# Altium integrated library RL2.IntLib: 663 symbols (part 2 of 4) (continued)
## L550R (continued)
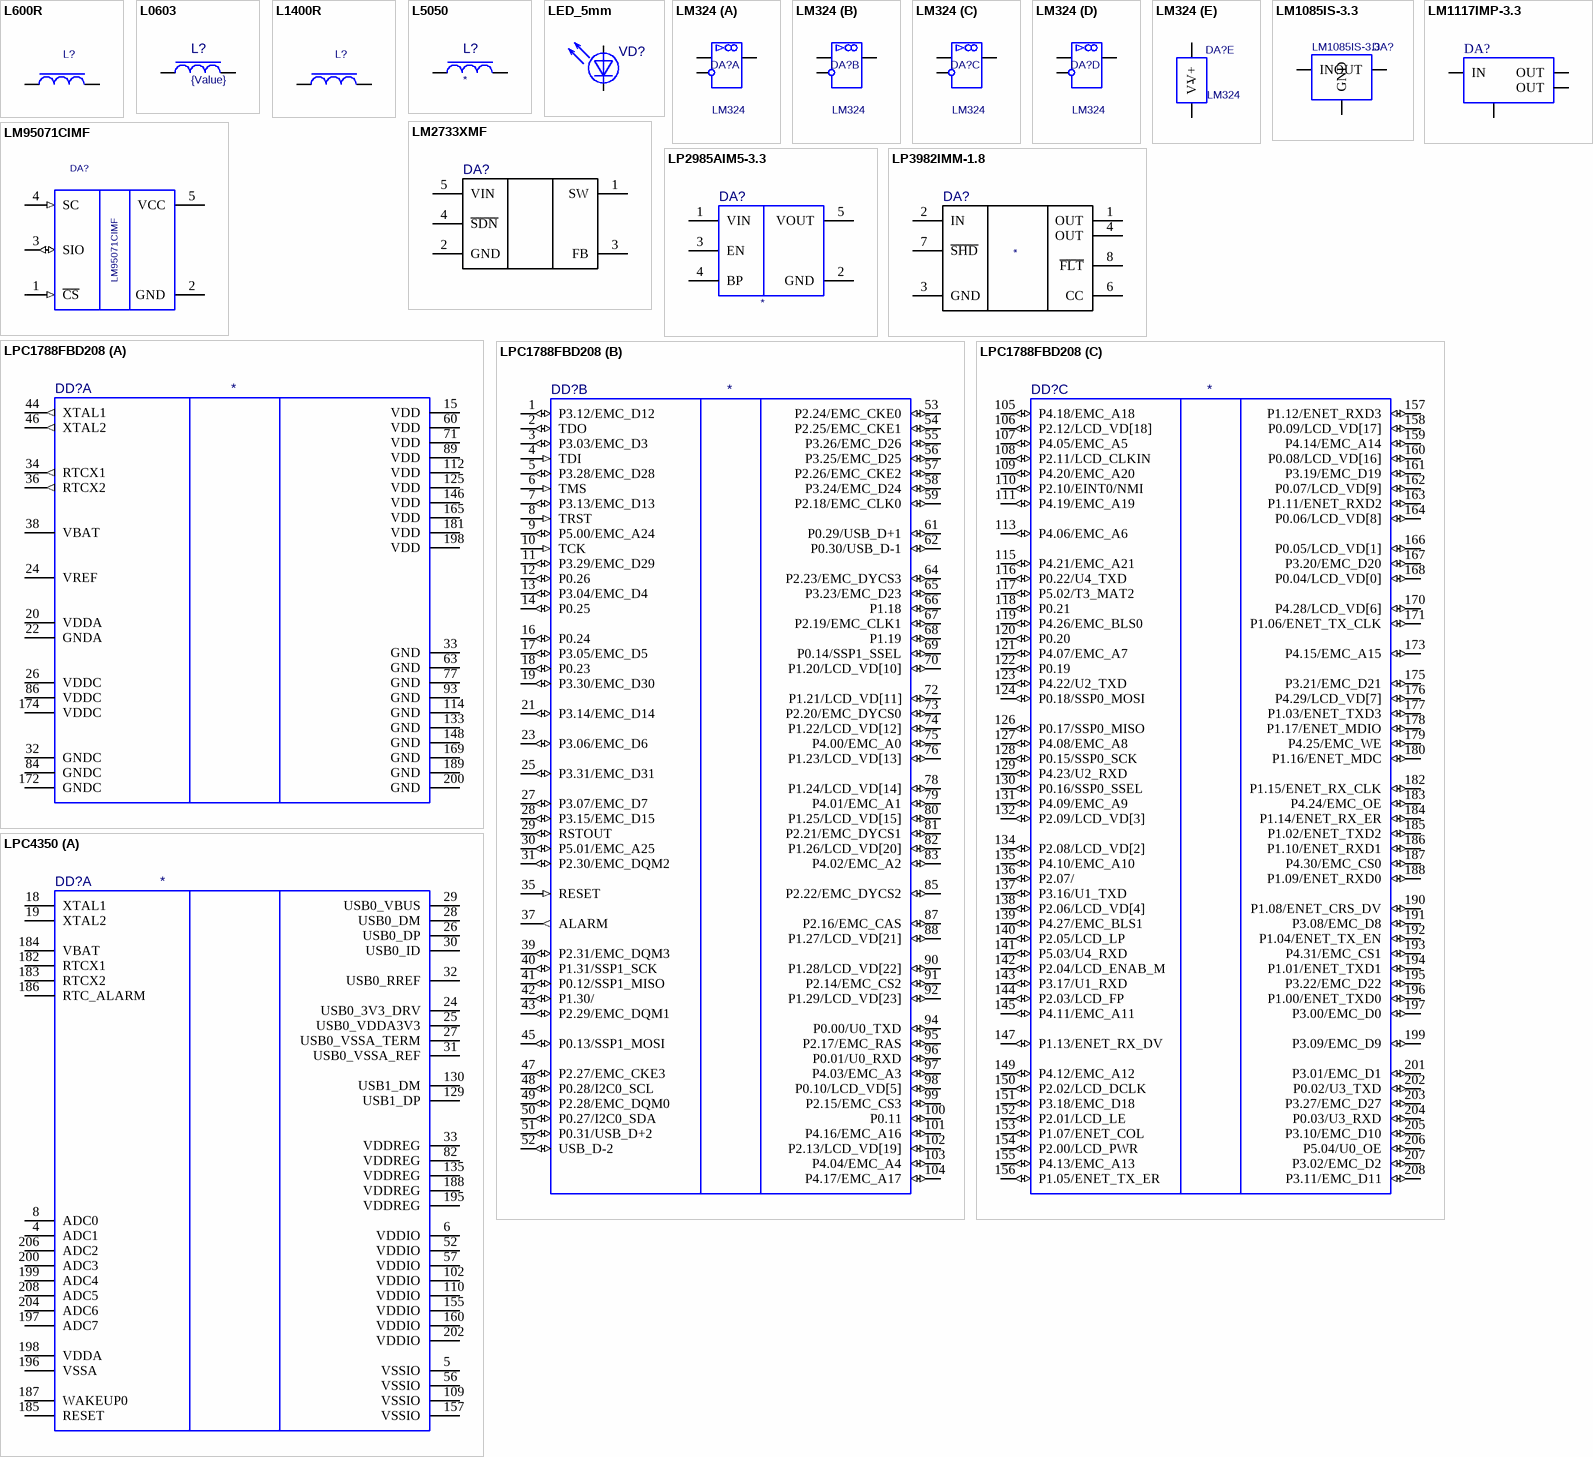
[diagram p14: symbols L600R to LPC4350]

## L600R
designator L?  (value not drawn)
L600R; Value: *
footprint L600R
pins: 1, 2

## L0603
designator L?  value {Value}  (hidden comment: *)
L0603
footprint L0603
pins: 1, 2

## L1400R
designator L?  (value not drawn)
L1400R; Value: *
footprint L1400R_L1400R-1
footprint L1400R_Primary
pins: 1 I/OA0, 2 I/OB

## L5050
designator L?
Value: *
footprint L5050
pins: 1, 2

## LED_5mm
designator VD?  (value not drawn)
footprint LED_5mm
pins: 1, 2

## LM324
designator DA?
Value: *
footprint DIP14_Primary
footprint DIP14_prim125
part A pins: 1, 2, 3
part B pins: 5, 6, 7
part C pins: 8, 9, 10
part D pins: 12, 13, 14
part E pins: 4 V+ (power), 11 V- (power)

## LM1085IS-3.3
designator DA?
Value: *
footprint TO-263
pins: 1 GND, 2 OUT, 3 IN, 4 hidden

## LM1117IMP-3.3
designator DA?  (value not drawn)
LM1117IMP-3.3; Value: *
footprint SOT-223
pins: 1 G, 2 OUT, 3 IN, 4 OUT

## LM2733XMF
designator DA?
footprint SOT23-5
pins: 1 SW, 2 GND, 3 FB, 4 ~{SDN}, 5 VIN

## LM95071CIMF
designator DA?
Value: *
footprint SOT23-5
signal-integrity model LM95071_si (Model Description)
pins: 1 ~{CS} (in), 2 GND (power), 3 SIO (io), 4 SC (in), 5 VCC (power)

## LP2985AIM5-3.3
designator DA?
footprint SOT23-5
pins: 1 VIN, 2 GND, 3 EN, 4 BP, 5 VOUT

## LP3982IMM-1.8
designator DA?
footprint MSOP8_LDO
pins: 1 OUT, 2 IN, 3 GND, 4 OUT, 6 CC, 7 ~{SHD}, 8 ~{F}~{LT}

## LPC1788FBD208
designator DD?
footprint QFP22-208
signal-integrity model Model Name (Model Description)
part A pins: 15 VDD (power), 20 VDDA (power), 22 GNDA (power), 24 VREF (power), 26 VDDC (power), 32 GNDC (power), 33 GND (power), 34 RTCX1 (out), 36 RTCX2 (out), 38 VBAT (power), 44 XTAL1 (out), 46 XTAL2 (out), 60 VDD (power), 63 GND (power), 71 VDD (power), 77 GND (power), 84 GNDC (power), 86 VDDC (power), 89 VDD (power), 93 GND (power), 112 VDD (power), 114 GND (power), 125 VDD (power), 133 GND (power), 146 VDD (power), 148 GND (power), 165 VDD (power), 169 GND (power), 172 GNDC (power), 174 VDDC (power), 181 VDD (power), 189 GND (power), 198 VDD (power), 200 GND (power)
part B pins: 1 P3.12/EMC_D12 (io), 2 TDO (io), 3 P3.03/EMC_D3 (io), 4 TDI (in), 5 P3.28/EMC_D28 (io), 6 TMS (in), 7 P3.13/EMC_D13 (io), 8 TRST (in), 9 P5.00/EMC_A24 (io), 10 TCK (in), 11 P3.29/EMC_D29 (io), 12 P0.26 (io), 13 P3.04/EMC_D4 (io), 14 P0.25 (io), 16 P0.24 (io), 17 P3.05/EMC_D5 (io), 18 P0.23 (io), 19 P3.30/EMC_D30 (io), 21 P3.14/EMC_D14 (io), 23 P3.06/EMC_D6 (io), 25 P3.31/EMC_D31 (io), 27 P3.07/EMC_D7 (io), 28 P3.15/EMC_D15 (io), 29 RSTOUT (io), 30 P5.01/EMC_A25 (io), 31 P2.30/EMC_DQM2 (io), 35 RESET (in), 37 ALARM (out), 39 P2.31/EMC_DQM3 (io), 40 P1.31/SSP1_SCK (io), 41 P0.12/SSP1_MISO (io), 42 P1.30/ (io), 43 P2.29/EMC_DQM1 (io), 45 P0.13/SSP1_MOSI (io), 47 P2.27/EMC_CKE3 (io), 48 P0.28/I2C0_SCL (io), 49 P2.28/EMC_DQM0 (io), 50 P0.27/I2C0_SDA (io), 51 P0.31/USB_D+2 (io), 52 USB_D-2 (io), 53 P2.24/EMC_CKE0 (io), 54 P2.25/EMC_CKE1 (io), 55 P3.26/EMC_D26 (io), 56 P3.25/EMC_D25 (io), 57 P2.26/EMC_CKE2 (io), 58 P3.24/EMC_D24 (io), 59 P2.18/EMC_CLK0 (io), 61 P0.29/USB_D+1 (io), 62 P0.30/USB_D-1 (io), 64 P2.23/EMC_DYCS3 (io), 65 P3.23/EMC_D23 (io), 66 P1.18 (io), 67 P2.19/EMC_CLK1 (io), 68 P1.19 (io), 69 P0.14/SSP1_SSEL (io), 70 P1.20/LCD_VD[10] (io), 72 P1.21/LCD_VD[11] (io), 73 P2.20/EMC_DYCS0 (io), 74 P1.22/LCD_VD[12] (io), 75 P4.00/EMC_A0 (io), 76 P1.23/LCD_VD[13] (io), 78 P1.24/LCD_VD[14] (io), 79 P4.01/EMC_A1 (io), 80 P1.25/LCD_VD[15] (io), 81 P2.21/EMC_DYCS1 (io), 82 P1.26/LCD_VD[20] (io), 83 P4.02/EMC_A2 (io), 85 P2.22/EMC_DYCS2 (io), 87 P2.16/EMC_CAS (io), 88 P1.27/LCD_VD[21] (io), 90 P1.28/LCD_VD[22] (io), 91 P2.14/EMC_CS2 (io), 92 P1.29/LCD_VD[23] (io), 94 P0.00/U0_TXD (io), 95 P2.17/EMC_RAS (io), 96 P0.01/U0_RXD (io), 97 P4.03/EMC_A3 (io), 98 P0.10/LCD_VD[5] (io), 99 P2.15/EMC_CS3 (io), 100 P0.11 (io), 101 P4.16/EMC_A16 (io), 102 P2.13/LCD_VD[19] (io), 103 P4.04/EMC_A4 (io), 104 P4.17/EMC_A17 (io)
part C pins: 105 P4.18/EMC_A18 (io), 106 P2.12/LCD_VD[18] (io), 107 P4.05/EMC_A5 (io), 108 P2.11/LCD_CLKIN (io), 109 P4.20/EMC_A20 (io), 110 P2.10/EINT0/NMI (io), 111 P4.19/EMC_A19 (io), 113 P4.06/EMC_A6 (io), 115 P4.21/EMC_A21 (io), 116 P0.22/U4_TXD (io), 117 P5.02/T3_MAT2 (io), 118 P0.21 (io), 119 P4.26/EMC_BLS0 (io), 120 P0.20 (io), 121 P4.07/EMC_A7 (io), 122 P0.19 (io), 123 P4.22/U2_TXD (io), 124 P0.18/SSP0_MOSI (io), 126 P0.17/SSP0_MISO (io), 127 P4.08/EMC_A8 (io), 128 P0.15/SSP0_SCK (io), 129 P4.23/U2_RXD (io), 130 P0.16/SSP0_SSEL (io), 131 P4.09/EMC_A9 (io), 132 P2.09/LCD_VD[3] (io), 134 P2.08/LCD_VD[2] (io), 135 P4.10/EMC_A10 (io), 136 P2.07/ (io), 137 P3.16/U1_TXD (io), 138 P2.06/LCD_VD[4] (io), 139 P4.27/EMC_BLS1 (io), 140 P2.05/LCD_LP (io), 141 P5.03/U4_RXD (io), 142 P2.04/LCD_ENAB_M (io), 143 P3.17/U1_RXD (io), 144 P2.03/LCD_FP (io), 145 P4.11/EMC_A11 (io), 147 P1.13/ENET_RX_DV (io), 149 P4.12/EMC_A12 (io), 150 P2.02/LCD_DCLK (io), 151 P3.18/EMC_D18 (io), 152 P2.01/LCD_LE (io), 153 P1.07/ENET_COL (io), 154 P2.00/LCD_PWR (io), 155 P4.13/EMC_A13 (io), 156 P1.05/ENET_TX_ER (io), 157 P1.12/ENET_RXD3 (io), 158 P0.09/LCD_VD[17] (io), 159 P4.14/EMC_A14 (io), 160 P0.08/LCD_VD[16] (io), 161 P3.19/EMC_D19 (io), 162 P0.07/LCD_VD[9] (io), 163 P1.11/ENET_RXD2 (io), 164 P0.06/LCD_VD[8] (io), 166 P0.05/LCD_VD[1] (io), 167 P3.20/EMC_D20 (io), 168 P0.04/LCD_VD[0] (io), 170 P4.28/LCD_VD[6] (io), 171 P1.06/ENET_TX_CLK (io), 173 P4.15/EMC_A15 (io), 175 P3.21/EMC_D21 (io), 176 P4.29/LCD_VD[7] (io), 177 P1.03/ENET_TXD3 (io), 178 P1.17/ENET_MDIO (io), 179 P4.25/EMC_WE (io), 180 P1.16/ENET_MDC (io), 182 P1.15/ENET_RX_CLK (io), 183 P4.24/EMC_OE (io), 184 P1.14/ENET_RX_ER (io), 185 P1.02/ENET_TXD2 (io), 186 P1.10/ENET_RXD1 (io), 187 P4.30/EMC_CS0 (io), 188 P1.09/ENET_RXD0 (io), 190 P1.08/ENET_CRS_DV (io), 191 P3.08/EMC_D8 (io), 192 P1.04/ENET_TX_EN (io), 193 P4.31/EMC_CS1 (io), 194 P1.01/ENET_TXD1 (io), 195 P3.22/EMC_D22 (io), 196 P1.00/ENET_TXD0 (io), 197 P3.00/EMC_D0 (io), 199 P3.09/EMC_D9 (io), 201 P3.01/EMC_D1 (io), 202 P0.02/U3_TXD (io), 203 P3.27/EMC_D27 (io), 204 P0.03/U3_RXD (io), 205 P3.10/EMC_D10 (io), 206 P5.04/U0_OE (io), 207 P3.02/EMC_D2 (io), 208 P3.11/EMC_D11 (io)

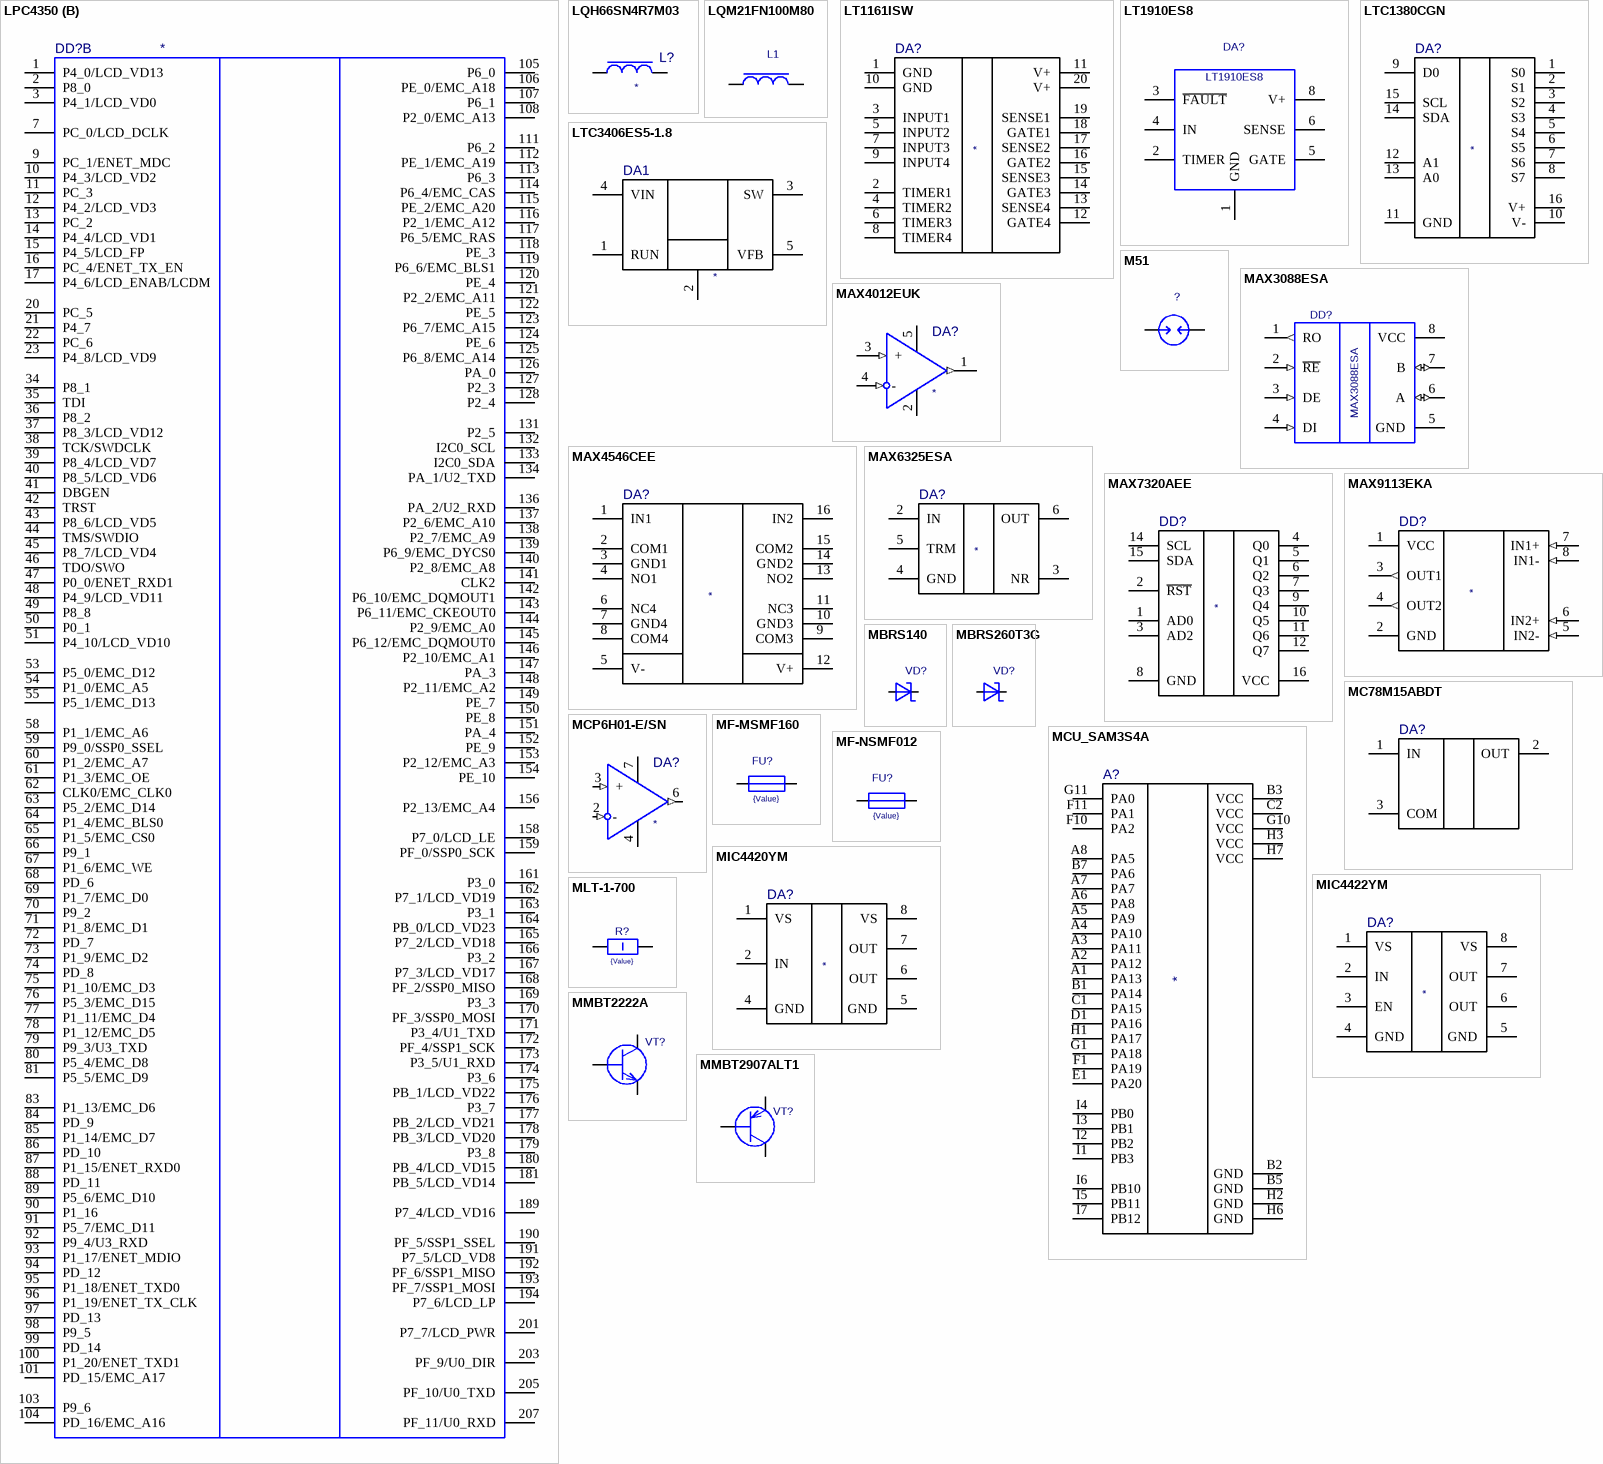
[diagram p15: symbols LPC4350 to MMBT2907ALT1]

## LPC4350
designator DD?
footprint QFP22-208
part A pins: 4 ADC1, 5 VSSIO, 6 VDDIO, 8 ADC0, 18 XTAL1, 19 XTAL2, 24 USB0_3V3_DRV, 25 USB0_VDDA3V3, 26 USB0_DP, 27 USB0_VSSA_TERM, 28 USB0_DM, 29 USB0_VBUS, 30 USB0_ID, 31 USB0_VSSA_REF, 32 USB0_RREF, 33 VDDREG, 52 VDDIO, 56 VSSIO, 57 VDDIO, 82 VDDREG, 102 VDDIO, 109 VSSIO, 110 VDDIO, 129 USB1_DP, 130 USB1_DM, 135 VDDREG, 155 VDDIO, 157 VSSIO, 160 VDDIO, 182 RTCX1, 183 RTCX2, 184 VBAT, 185 RESET, 186 RTC_ALARM, 187 WAKEUP0, 188 VDDREG, 195 VDDREG, 196 VSSA, 197 ADC7, 198 VDDA, 199 ADC4, 200 ADC3, 202 VDDIO, 204 ADC6, 206 ADC2, 208 ADC5
part B pins: 1 P4_0/LCD_VD13, 2 P8_0, 3 P4_1/LCD_VD0, 7 PC_0/LCD_DCLK, 9 PC_1/ENET_MDC, 10 P4_3/LCD_VD2, 11 PC_3, 12 P4_2/LCD_VD3, 13 PC_2, 14 P4_4/LCD_VD1, 15 P4_5/LCD_FP, 16 PC_4/ENET_TX_EN, 17 P4_6/LCD_ENAB/LCDM, 20 PC_5, 21 P4_7, 22 PC_6, 23 P4_8/LCD_VD9, 34 P8_1, 35 TDI, 36 P8_2, 37 P8_3/LCD_VD12, 38 TCK/SWDCLK, 39 P8_4/LCD_VD7, 40 P8_5/LCD_VD6, 41 DBGEN, 42 TRST, 43 P8_6/LCD_VD5, 44 TMS/SWDIO, 45 P8_7/LCD_VD4, 46 TDO/SWO, 47 P0_0/ENET_RXD1, 48 P4_9/LCD_VD11, 49 P8_8, 50 P0_1, 51 P4_10/LCD_VD10, 53 P5_0/EMC_D12, 54 P1_0/EMC_A5 , 55 P5_1/EMC_D13, 58 P1_1/EMC_A6, 59 P9_0/SSP0_SSEL, 60 P1_2/EMC_A7, 61 P1_3/EMC_OE, 62 CLK0/EMC_CLK0, 63 P5_2/EMC_D14, 64 P1_4/EMC_BLS0, 65 P1_5/EMC_CS0 , 66 P9_1, 67 P1_6/EMC_WE, 68 PD_6, 69 P1_7/EMC_D0, 70 P9_2, 71 P1_8/EMC_D1, 72 PD_7, 73 P1_9/EMC_D2, 74 PD_8, 75 P1_10/EMC_D3, 76 P5_3/EMC_D15, 77 P1_11/EMC_D4, 78 P1_12/EMC_D5, 79 P9_3/U3_TXD, 80 P5_4/EMC_D8, 81 P5_5/EMC_D9, 83 P1_13/EMC_D6, 84 PD_9, 85 P1_14/EMC_D7, 86 PD_10, 87 P1_15/ENET_RXD0, 88 PD_11, 89 P5_6/EMC_D10, 90 P1_16, 91 P5_7/EMC_D11, 92 P9_4/U3_RXD, 93 P1_17/ENET_MDIO, 94 PD_12, 95 P1_18/ENET_TXD0, 96 P1_19/ENET_TX_CLK, 97 PD_13, 98 P9_5, 99 PD_14, 100 P1_20/ENET_TXD1, 101 PD_15/EMC_A17, 103 P9_6, 104 PD_16/EMC_A16, 105 P6_0, 106 PE_0/EMC_A18, 107 P6_1, 108 P2_0/EMC_A13, 111 P6_2, 112 PE_1/EMC_A19, 113 P6_3, 114 P6_4/EMC_CAS, 115 PE_2/EMC_A20, 116 P2_1/EMC_A12, 117 P6_5/EMC_RAS, 118 PE_3, 119 P6_6/EMC_BLS1, 120 PE_4, 121 P2_2/EMC_A11, 122 PE_5, 123 P6_7/EMC_A15, 124 PE_6, 125 P6_8/EMC_A14, 126 PA_0, 127 P2_3, 128 P2_4, 131 P2_5, 132 I2C0_SCL, 133 I2C0_SDA, 134 PA_1/U2_TXD, 136 PA_2/U2_RXD, 137 P2_6/EMC_A10, 138 P2_7/EMC_A9, 139 P6_9/EMC_DYCS0, 140 P2_8/EMC_A8, 141 CLK2, 142 P6_10/EMC_DQMOUT1, 143 P6_11/EMC_CKEOUT0, 144 P2_9/EMC_A0, 145 P6_12/EMC_DQMOUT0, 146 P2_10/EMC_A1, 147 PA_3, 148 P2_11/EMC_A2, 149 PE_7, 150 PE_8, 151 PA_4, 152 PE_9, 153 P2_12/EMC_A3, 154 PE_10, 156 P2_13/EMC_A4, 158 P7_0/LCD_LE, 159 PF_0/SSP0_SCK, 161 P3_0, 162 P7_1/LCD_VD19, 163 P3_1, 164 PB_0/LCD_VD23, 165 P7_2/LCD_VD18, 166 P3_2, 167 P7_3/LCD_VD17, 168 PF_2/SSP0_MISO, 169 P3_3, 170 PF_3/SSP0_MOSI, 171 P3_4/U1_TXD, 172 PF_4/SSP1_SCK, 173 P3_5/U1_RXD, 174 P3_6, 175 PB_1/LCD_VD22, 176 P3_7, 177 PB_2/LCD_VD21, 178 PB_3/LCD_VD20, 179 P3_8, 180 PB_4/LCD_VD15, 181 PB_5/LCD_VD14, 189 P7_4/LCD_VD16, 190 PF_5/SSP1_SSEL, 191 P7_5/LCD_VD8, 192 PF_6/SSP1_MISO, 193 PF_7/SSP1_MOSI, 194 P7_6/LCD_LP, 201 P7_7/LCD_PWR, 203 PF_9/U0_DIR, 205 PF_10/U0_TXD, 207 PF_11/U0_RXD

## LQH66SN4R7M03
designator L?
footprint L2525
pins: 1, 2

## LQM21FN100M80
designator L1  (value not drawn)
LQM21FN100M80; Value: 10uH
footprint R0805
pins: 1, 2

## LT1161ISW
designator DA?
footprint SO20
pins: 1 GND, 2 TIMER1, 3 INPUT1, 4 TIMER2, 5 INPUT2, 6 TIMER3, 7 INPUT3, 8 TIMER4, 9 INPUT4, 10 GND, 11 V+, 12 GATE4, 13 SENSE4, 14 GATE3, 15 SENSE3, 16 GATE2, 17 SENSE2, 18 GATE1, 19 SENSE1, 20 V+

## LT1910ES8
designator DA?
Value: *
footprint SOIC8 JEDEC
pins: 1 GND, 2 TIMER, 3 ~{FAULT}, 4 IN, 5 GATE, 6 SENSE, 7 hidden, 8 V+

## LTC1380CGN
designator DA?
footprint SSOP16 (JEDEC MO-137)
pins: 1 S0, 2 S1, 3 S2, 4 S3, 5 S4, 6 S5, 7 S6, 8 S7, 9 D0, 10 V-, 11 GND, 12 A1, 13 A0, 14 SDA, 15 SCL, 16 V+

## LTC3406ES5-1.8
designator DA1
footprint SOT23-5
pins: 1 RUN, 2 GND, 3 SW, 4 VIN, 5 VFB

## M51
designator ?  (value not drawn)
Value: {Value}
footprint M51
pins: 1, 2

## MAX3088ESA
designator DD?
Value: *
footprint SOIC8 JEDEC
pins: 1 RO (out), 2 ~{RE} (in), 3 DE (in), 4 DI (in), 5 GND (power), 6 A (io), 7 B (io), 8 VCC (power)

## MAX4012EUK
designator DA?
footprint SOT23-5
pins: 1 OUT (out), 2 V- (power), 3 + (in), 4 - (in), 5 V+ (power)

## MAX4546CEE
designator DA?
footprint SSOP16 (JEDEC MO-137)
pins: 1 IN1, 2 COM1, 3 GND1, 4 NO1, 5 V-, 6 NC4, 7 GND4, 8 COM4, 9 COM3, 10 GND3, 11 NC3, 12 V+, 13 NO2, 14 GND2, 15 COM2, 16 IN2

## MAX6325ESA
designator DA?
footprint SOIC8 JEDEC
pins: 2 IN, 3 NR, 4 GND, 5 TRM, 6 OUT

## MAX7320AEE
designator DD?
footprint SSOP16 (JEDEC MO-137)
pins: 1 AD0, 2 ~{RST}, 3 AD2, 4 Q0, 5 Q1, 6 Q2, 7 Q3, 8 GND, 9 Q4, 10 Q5, 11 Q6, 12 Q7, 14 SCL, 15 SDA, 16 VCC

## MAX9113EKA
designator DD?
footprint SOT23-8
signal-integrity model Model Name (Model Description)
pins: 1 VCC (power), 2 GND (power), 3 OUT1 (out), 4 OUT2 (out), 5 IN2- (in), 6 IN2+ (in), 7 IN1+ (in), 8 IN1- (in)

## MBRS140
designator VD?  (value not drawn)
MBRS140; Value: *
footprint DO-214AA SMB
pins: 1, 2

## MBRS260T3G
designator VD?  (value not drawn)
MBRS260T3G; Value: *
footprint SMB
pins: 1, 2

## MC78M15ABDT
designator DA?
footprint D-PAK (TO-252)
pins: 1 IN, 2 OUT, 3 COM

## MCP6H01-E/SN
designator DA?
footprint SOIC8 JEDEC
pins: 2 - (in), 3 + (in), 4 V- (power), 6 OUT (out), 7 V+ (power)

## MCU_SAM3S4A
designator A?
footprint MCU_SAM3S4A
pins: A1 PA13, A2 PA12, A3 PA11, A4 PA10, A5 PA9, A6 PA8, A7 PA7, A8 PA5, B1 PA14, B2 GND, B3 VCC, B5 GND, B7 PA6, C1 PA15, C2 VCC, D1 PA16, E1 PA20, F1 PA19, F10 PA2, F11 PA1, G1 PA18, G10 VCC, G11 PA0, H1 PA17, H2 GND, H3 VCC, H6 GND, H7 VCC, I1 PB3, I2 PB2, I3 PB1, I4 PB0, I5 PB11, I6 PB10, I7 PB12

## MF-MSMF160
designator FU?  value {Value}  (hidden comment: *)
MF-MSMF160
footprint FUSE1812
pins: 1, 2

## MF-NSMF012
designator FU?  value {Value}  (hidden comment: *)
MF-NSMF012
footprint FUSE1206
pins: 1, 2

## MIC4420YM
designator DA?
footprint SOIC8 JEDEC
pins: 1 VS, 2 IN, 4 GND, 5 GND, 6 OUT, 7 OUT, 8 VS

## MIC4422YM
designator DA?
footprint SOIC8 JEDEC
pins: 1 VS, 2 IN, 3 EN, 4 GND, 5 GND, 6 OUT, 7 OUT, 8 VS

## MLT-1-700
designator R?  value {Value}  (hidden comment: *)
MLT-1-700
footprint MLT-1-700
pins: 1, 2

## MMBT2222A
designator VT?  (value not drawn)
MMBT2222A; Value: *
footprint SOT-23_MMBT2222A(Primary)
pins: 1 C, 2 B, 3 E

## MMBT2907ALT1
designator VT?  (value not drawn)
MMBT2907ALT1; Value: *
footprint SOT-23
pins: 1 B, 2 E, 3 C
